# Altium schematic symbol library LATTICEPLDS_Library.SchLib: 291 symbols (part 26 of 32)
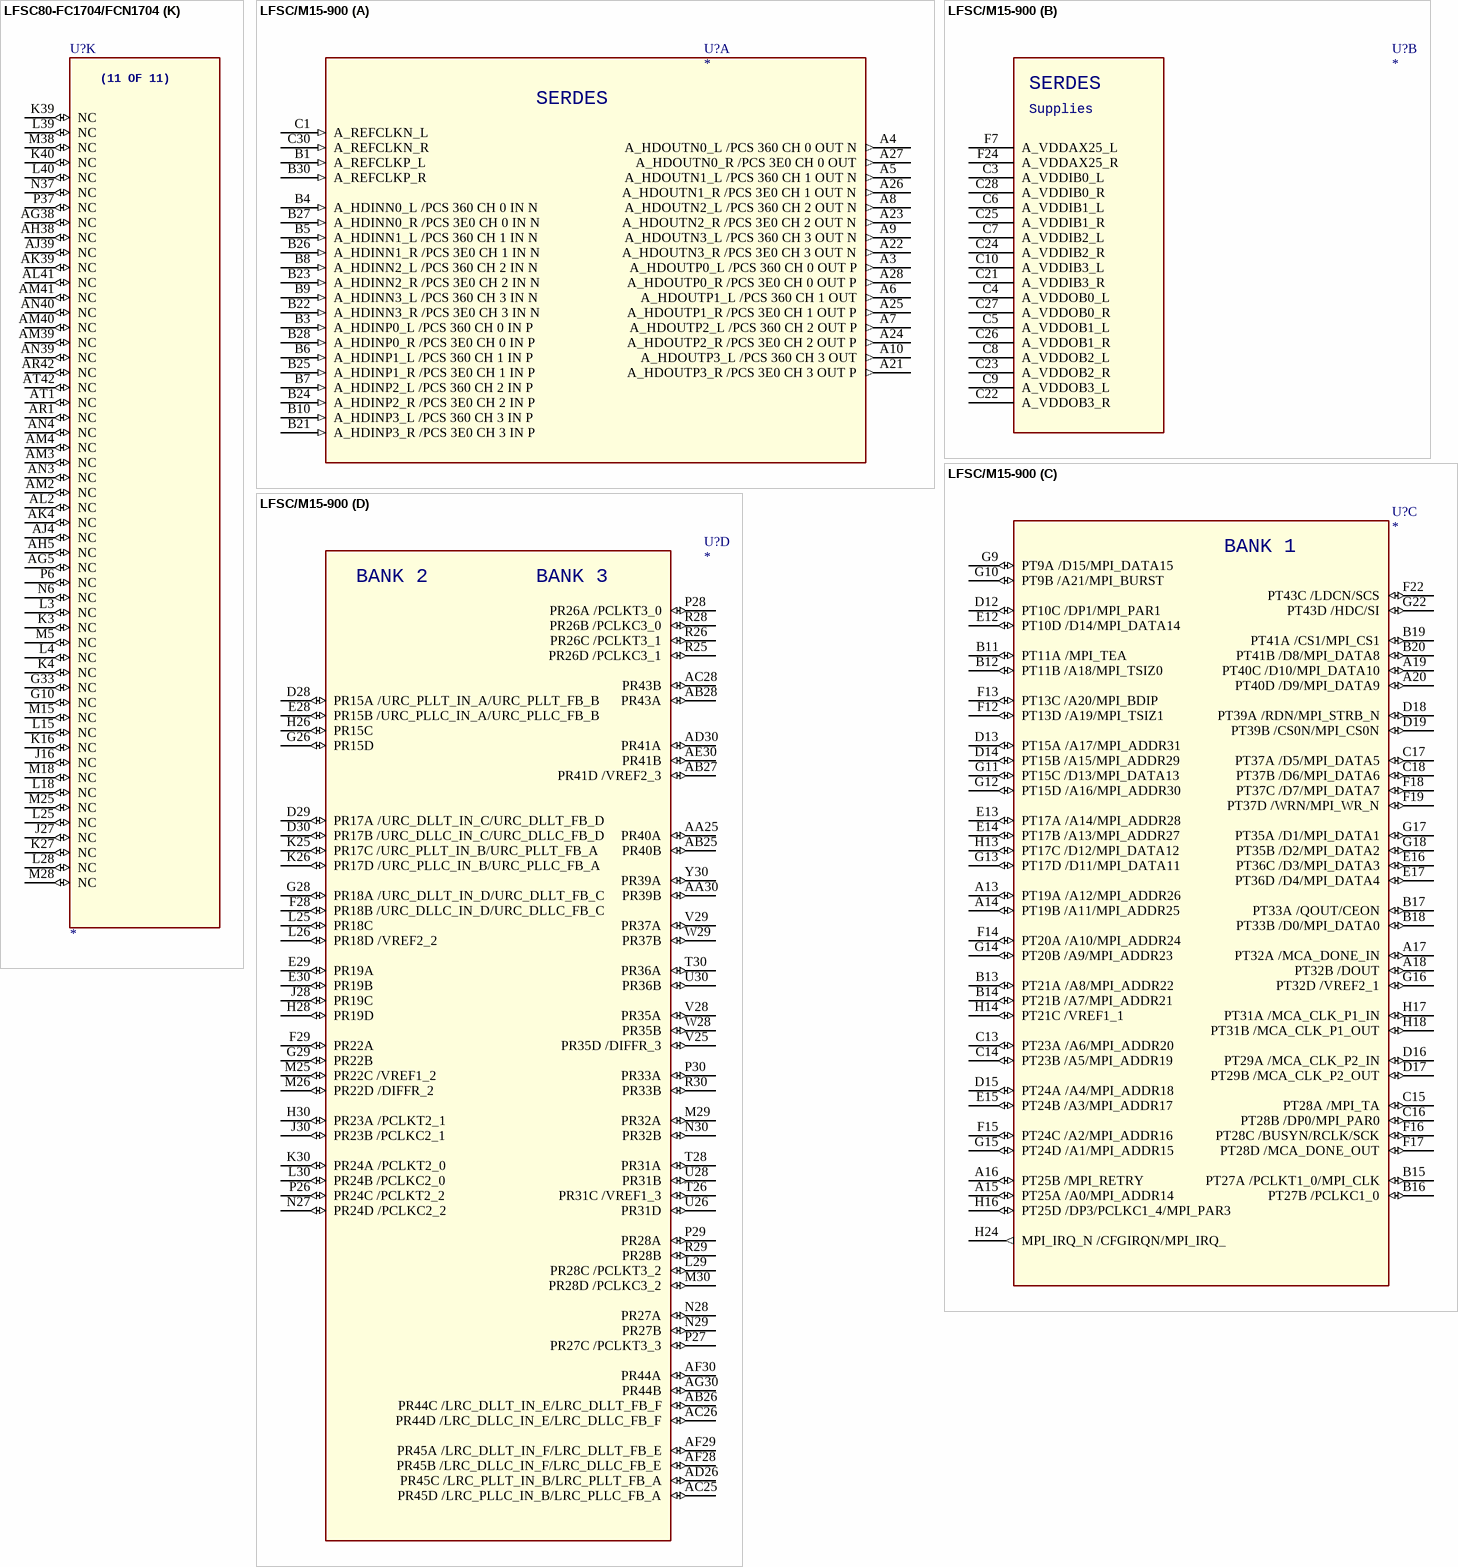
[diagram p328: symbols LFSC80-FC1704/FCN1704 to LFSC/M15-900]

## LFSC80-FC1704/FCN1704
designator U?
SPLIT_INST: TRUE; SWAP_INFO: (S1+S2+S3+S4+S5+S6+S7+S8+S9+S10+S11)
part A pins: AA28 VTT_7 (io), AA29 VTT_7 (io), AA31 PL38D (io), AA32 PL43D (io), AA33 PL47C / PCLKT7_3 (io), AA34 PL48C / PCLKT7_2 (io), AA40 VCCIO7 (io), AB33 PL47D / PCLKC7_3 (io), AB34 PL48D / PCLKC7_2 (io), G40 PL17A / ULC_DLLT_IN_C/ULC_DLLT_FB_D (io), G41 PL18A / ULC_DLLT_IN_D/ULC_DLLT_FB_C (io), G42 PL20A (io), H36 VCCIO7 (io), H40 PL17B / ULC_DLLC_IN_C/ULC_DLLC_FB_D (io), H41 PL18B / ULC_DLLC_IN_D/ULC_DLLC_FB_C (io), H42 PL20B (io), J36 PL25C (io), J37 PL16A / ULC_PLLT_IN_A/ULC_PLLT_FB_B (io), J38 PL16B / ULC_PLLC_IN_A/ULC_PLLC_FB_B (io), J40 VCCIO7 (io), J41 PL24A (io), J42 PL25B (io), K36 PL25D (io), K37 PL21A (io), K38 PL22A (io), K41 PL24B (io), K42 PL25A (io), L35 VCCIO7 (io), L37 PL21B (io), L38 PL22B (io), L41 PL30A (io), L42 PL31A (io), M34 PL20C (io), M35 PL20D (io), M36 PL33C (io), M37 PL33D (io), M39 VCCIO7 (io), M41 PL30B (io), M42 PL31B (io), N33 PL17C / ULC_PLLT_IN_B/ULC_PLLT_FB_A (io), N34 PL21C (io), N35 PL26C (io), N36 PL26D (io), N38 PL26A (io), N39 PL29A (io), N40 PL34B (io), N41 PL35A (io), N42 PL38A (io), P32 PL16C (io), P33 PL17D / ULC_PLLC_IN_B/ULC_PLLC_FB_A (io), P34 PL21D (io), P36 VCCIO7 (io), P38 PL26B (io), P39 PL29B (io), P40 PL34A (io), P41 PL35B (io), P42 PL38B (io), R31 VTT_7 (io), R32 PL16D (io), R33 PL22D (io), R34 PL29C / VREF1_7 (io), R35 PL34C (io), R36 PL37C (io), R37 PL33A (io), R38 PL37A (io), R40 VCCIO7 (io), R41 PL42A (io), R42 PL48A / PCLKT7_0 (io), T29 PL18C (io), T31 VCCIO7 (io), T33 PL22C (io), T34 PL29D / DIFFR_7 (io), T35 PL34D (io), T36 PL37D (io), T37 PL33B (io), T38 PL37B (io), T39 PL41B (io), T40 PL47A / PCLKT7_1 (io), T41 PL42B (io), T42 PL48B / PCLKC7_0 (io), U29 PL18D / VREF2_7 (io), U31 PL24C (io), U32 PL31C (io), U33 PL35D (io), U34 PL39C (io), U35 VCCIO7 (io), U37 PL39A (io), U38 PL46A (io), U39 PL41A (io), U40 PL47B / PCLKC7_1 (io), V29 VTT_7 (io), V31 PL24D (io), V32 PL31D (io), V33 PL35C (io), V34 PL39D (io), V35 PL41C (io), V37 PL39B (io), V38 PL46B (io), V39 VCCIO7 (io), W29 PL30C (io), W32 VCCIO7 (io), W33 PL42C (io), W34 PL46C (io), W35 PL41D (io), W37 PL43A (io), Y29 PL30D (io), Y31 PL38C (io), Y32 PL43C (io), Y33 PL42D (io), Y34 PL46D (io), Y36 VCCIO7 (io), Y37 PL43B (io)
part B pins: AA35 PCLKT6_2 / PL52C (io), AA36 PL56C (io), AA37 PL57C (io), AA38 PL60A (io), AA41 PL61A (io), AA42 PL63A (io), AB28 VTT_6 (io), AB29 VTT_6 (io), AB31 PCLKT6_3 / PL51C (io), AB32 VREF1_6 / PL55C (io), AB35 PCLKC6_2 / PL52D (io), AB36 PL56D (io), AB37 PL57D (io), AB38 PL60B (io), AB39 VCCIO6 (io), AB41 PL61B (io), AB42 PL63B (io), AC29 PL60C (io), AC31 PCLKC6_3 / PL51D (io), AC32 PL55D (io), AC33 PL59C (io), AC34 PL61C (io), AC36 VCCIO6 (io), AC37 PL63C (io), AC38 PL64A (io), AC39 PL65A (io), AC40 PL67A (io), AC41 PL68A (io), AC42 PL69A (io), AD29 PL60D (io), AD32 VCCIO6 (io), AD33 PL59D (io), AD34 PL61D (io), AD35 PL65C (io), AD36 PL64C (io), AD37 PL63D (io), AD38 PL64B (io), AD39 PL65B (io), AD40 PL67B (io), AD41 PL68B (io), AD42 PL69B (io), AE29 VTT_6 (io), AE31 PL73C (io), AE32 PL72C (io), AE33 PL69C (io), AE34 PL68C (io), AE35 PL65D (io), AE36 PL64D (io), AE37 PL67C (io), AE38 PL72A (io), AE40 VCCIO6 (io), AE41 PL73A (io), AE42 PL74A (io), AF29 PL77C (io), AF31 PL73D (io), AF32 PL72D (io), AF33 PL69D (io), AF34 PL68D (io), AF35 VCCIO6 (io), AF37 PL67D (io), AF38 PL72B (io), AF39 PL77A (io), AF40 PL76A (io), AF41 PL73B (io), AF42 PL74B (io), AG29 PL77D (io), AG31 VCCIO6 (io), AG33 PL81C (io), AG34 PL80C (io), AG35 PL78C (io), AG36 PL76C (io), AG37 PL74C (io), AG39 PL77B (io), AG40 PL76B (io), AG41 PL80A (io), AG42 PL78B (io), AH31 PL90C (io), AH32 PL85C (io), AH33 PL81D (io), AH34 PL80D (io), AH35 PL78D (io), AH36 DIFFR_6 / PL76D (io), AH37 PL74D (io), AH39 VCCIO6 (io), AH41 PL80B (io), AH42 PL78A (io), AJ30 VTT_6 (io), AJ31 PL90D (io), AJ32 PL85D (io), AJ33 PL89C (io), AJ34 PL84C (io), AJ36 VCCIO6 (io), AJ37 PL82C (io), AJ38 PL85A (io), AJ40 PL84A (io), AJ41 PL82A (io), AJ42 PL81A (io), AK32 VCCIO6 (io), AK33 VREF2_6 / PL89D (io), AK34 PL84D (io), AK35 PL91C (io), AK36 PL86C (io), AK37 PL82D (io), AK38 PL85B (io), AK40 PL84B (io), AK41 PL82B (io), AK42 PL81B (io), AL35 PL91D (io), AL36 PL86D (io), AL37 LLC_DLLT_IN_E/LLC_DLLT_FB_F / PL93C (io), AL38 PL89A (io), AL40 VCCIO6 (io), AL42 PL86A (io), AM35 VCCIO6 (io), AM37 LLC_DLLC_IN_E/LLC_DLLC_FB_F / PL93D (io), AM38 PL89B (io), AM42 PL86B (io), AN36 LLC_PLLT_IN_B/LLC_PLLT_FB_A / PL95C (io), AN37 PL94C (io), AN38 PL93A (io), AN41 PL91A (io), AN42 PL90A (io), AP36 LLC_PLLC_IN_B/LLC_PLLC_FB_A / PL95D (io), AP37 PL94D (io), AP38 PL93B (io), AP39 VCCIO6 (io), AP41 PL91B (io), AP42 PL90B (io), AR36 VCCIO6 (io), AR39 LLC_DLLT_IN_F/LLC_DLLT_FB_E / PL95A (io), AR40 LLC_DLLC_IN_F/LLC_DLLC_FB_E / PL95B (io), AR41 PL94A (io), AT41 PL94B (io), AU40 VCCIO6 (io), AU41 TEMP (io), U41 PCLKT6_0 / PL50A (io), U42 PL51A (io), V36 PCLKT6_1 / PL50C (io), V41 PCLKC6_0 / PL50B (io), V42 PL51B (io), W36 PCLKC6_1 / PL50D (io), W38 PL52A (io), W39 PL55A (io), W40 PL56A (io), W41 PL57A (io), W42 PL59A (io), Y38 PL52B (io), Y39 PL55B (io), Y40 PL56B (io), Y41 PL57B (io), Y42 PL59B (io)
part C pins: AH22 VTT_5 (io), AJ22 VTT_5 (io), AJ23 VTT_5 (io), AJ24 VTT_5 (io), AJ25 VTT_5 (io), AJ26 PB28C (io), AJ27 PB28D (io), AK29 PB5D / VREF1_5 (io), AK30 PB5C (io), AL22 PB60D (io), AL23 PB56D (io), AL25 PB45C (io), AL26 PB36D (io), AL27 VCCIO5 (io), AL28 PB19D (io), AL29 PB15D (io), AL31 PB11D (io), AL32 PB11C (io), AL33 PB3C / LLC_DLLT_IN_C/LLC_DLLT_FB_D (io), AL34 PB3D / LLC_DLLC_IN_C/LLC_DLLC_FB_D (io), AM22 PB60C (io), AM23 PB56C (io), AM24 VCCIO5 (io), AM25 PB45D (io), AM26 PB36C (io), AM28 PB19C (io), AM29 PB15C (io), AM30 VCCIO5 (io), AM31 PB13C (io), AM32 PB13D (io), AM33 PB4D (io), AM34 PB4C (io), AN22 PB61C (io), AN23 PB57C (io), AN24 PB52D / PCLKC5_6 (io), AN25 PB47C (io), AN26 PB41D (io), AN27 PB37D (io), AN28 PB33C (io), AN29 PB31C (io), AN30 PB24D (io), AN31 PB24C (io), AN32 PB16D (io), AN33 PB16C (io), AN34 PB8D (io), AN35 PB8C (io), AP22 PB61D (io), AP23 PB57D (io), AP24 PB52C / PCLKT5_6 (io), AP25 PB47D (io), AP26 PB41C (io), AP27 PB37C (io), AP28 PB33D (io), AP29 PB31D (io), AP30 PB25D (io), AP31 PB25C (io), AP32 PB23D (io), AP33 PB23C (io), AP34 PB9C (io), AP35 PB9D (io), AR22 PB63D (io), AR24 PB51D / VREF2_5 (io), AR25 PB51C (io), AR26 VCCIO5 (io), AR27 PB40D (io), AR28 PB40C (io), AR30 PB32D (io), AR31 PB32C (io), AR32 VCCIO5 (io), AR33 PB20D (io), AR34 PB20C (io), AR37 PB7C (io), AR38 PB7D (io), AT22 PB63C (io), AT23 VCCIO5 (io), AT24 PB48D / PCLKC5_4 (io), AT25 PB48C / PCLKT5_4 (io), AT27 PB44D (io), AT28 PB44C (io), AT29 VCCIO5 (io), AT30 PB35C (io), AT31 PB35D (io), AT33 PB21C (io), AT34 PB21D (io), AT35 VCCIO5 (io), AT36 PB17D (io), AT37 PB17C (io), AT38 PB12D (io), AT39 PB12C (io), AU22 PB59D (io), AU23 PB59C (io), AU24 PB55C (io), AU25 PB55D (io), AU26 PB53D / PCLKC5_7 (io), AU27 PB53C / PCLKT5_7 (io), AU28 PB49D (io), AU29 PB49C (io), AU30 PB43C (io), AU31 PB43D (io), AU32 PB39C (io), AU33 PB39D (io), AU34 PB29D (io), AU35 PB29C (io), AU36 PB27C (io), AU37 PB27D (io), AU38 PB4A / LLC_DLLT_IN_D/LLC_DLLT_FB_C (io), AU42 PB3A / LLC_PLLT_IN_A/LLC_PLLT_FB_B (io), AV22 PB60B (io), AV23 PB60A (io), AV24 PB53B / PCLKC5_2 (io), AV25 PB53A / PCLKT5_2 (io), AV26 PB44B (io), AV27 PB44A (io), AV28 PB41B (io), AV29 PB41A (io), AV30 PB33B (io), AV31 PB33A (io), AV32 PB27B (io), AV33 PB27A (io), AV34 PB21B (io), AV35 PB21A (io), AV36 PB13B (io), AV37 PB13A (io), AV38 PB4B / LLC_DLLC_IN_D/LLC_DLLC_FB_C (io), AV39 PB8B (io), AV40 PB8A (io), AV41 PB5A (io), AV42 PB3B / LLC_PLLC_IN_A/LLC_PLLC_FB_B (io), AW23 PB57B (io), AW24 PB57A (io), AW25 VCCIO5 (io), AW26 PB49B / PCLKC5_5 (io), AW27 PB49A / PCLKT5_5 (io), AW29 PB37B (io), AW30 PB37A (io), AW31 VCCIO5 (io), AW32 PB29B (io), AW33 PB29A (io), AW35 PB19B (io), AW36 PB19A (io), AW37 VCCIO5 (io), AW38 PB11B (io), AW39 PB11A (io), AW40 PB9A (io), AW41 PB5B (io), AW42 PB7A (io), AY22 VCCIO5 (io), AY23 PB59A (io), AY24 PB59B (io), AY26 PB48B / PCLKC5_3 (io), AY27 PB48A / PCLKT5_3 (io), AY28 VCCIO5 (io), AY29 PB43B (io), AY30 PB43A (io), AY32 PB32B (io), AY33 PB32A (io), AY34 VCCIO5 (io), AY35 PB24B (io), AY36 PB24A (io), AY38 PB16B (io), AY39 PB16A (io), AY40 PB9B (io), AY41 PB12A (io), AY42 PB7B (io), BA22 PB61B (io), BA23 PB61A (io), BA24 PB55B (io), BA25 PB55A (io), BA26 PB52B / PCLKC5_1 (io), BA27 PB52A / PCLKT5_1 (io), BA28 PB45B (io), BA29 PB45A (io), BA30 PB39B (io), BA31 PB39A (io), BA32 PB35B (io), BA33 PB35A (io), BA34 PB28B (io), BA35 PB28A (io), BA36 PB23B (io), BA37 PB23A (io), BA38 PB17B (io), BA39 PB17A (io), BA40 PB15A (io), BA41 PB12B (io), BB22 PB63B (io), BB23 PB63A (io), BB24 PB56A (io), BB25 PB56B (io), BB26 PB51B / PCLKC5_0 (io), BB27 PB51A / PCLKT5_0 (io), BB28 PB47B (io), BB29 PB47A (io), BB30 PB40B (io), BB31 PB40A (io), BB32 PB36B (io), BB33 PB36A (io), BB34 PB31B (io), BB35 PB31A (io), BB36 PB25B (io), BB37 PB25A (io), BB38 PB20A (io), BB39 PB20B (io), BB40 PB15B (io)
part D pins: AH21 VTT_4 (io), AJ16 PB99C (io), AJ17 PB99D (io), AJ18 VTT_4 (io), AJ19 VTT_4 (io), AJ20 VTT_4 (io), AJ21 VTT_4 (io), AK13 PB123D (io), AK14 VREF1_4 / PB123C (io), AL9 LRC_DLLC_IN_D/LRC_DLLC_FB_C / PB125D (io), AL10 LRC_DLLT_IN_D/LRC_DLLT_FB_C / PB125C (io), AL11 PB120D (io), AL12 PB120C (io), AL14 PB112D (io), AL15 PB100D (io), AL16 VCCIO4 (io), AL17 PB88D (io), AL18 PB81C (io), AL20 PB71D (io), AL21 PB67D (io), AM9 PB124D (io), AM10 PB124C (io), AM11 PB115D (io), AM12 PB115C (io), AM13 VCCIO4 (io), AM14 PB112C (io), AM15 PB100C (io), AM17 PB88C (io), AM18 PB81D (io), AM19 VCCIO4 (io), AM20 PB71C (io), AM21 PB67C (io), AN8 PB121D (io), AN9 PB121C (io), AN10 PB113D (io), AN11 PB113C (io), AN12 PB105D (io), AN13 PB105C (io), AN14 PB96D (io), AN15 PB92D (io), AN16 PB89D (io), AN17 PB83D (io), AN18 PB79C (io), AN19 PCLKT4_7 / PB74C (io), AN20 PB70D (io), AN21 PB66D (io), AP8 PB117D (io), AP9 PB117C (io), AP10 PB108D (io), AP11 PB108C (io), AP12 PB101D (io), AP13 PB101C (io), AP14 PB96C (io), AP15 PB92C (io), AP16 PB89C (io), AP17 PB83C (io), AP18 PB79D (io), AP19 PCLKC4_7 / PB74D (io), AP20 PB70C (io), AP21 PB66C (io), AR5 PB119D (io), AR6 PB119C (io), AR9 PB109D (io), AR10 PB109C (io), AR11 VCCIO4 (io), AR12 PB95D (io), AR13 PB95C (io), AR15 PB85D (io), AR16 PB85C (io), AR17 VCCIO4 (io), AR18 PB77D (io), AR19 VREF2_4 / PB77C (io), AR21 PB65C (io), AT4 PB116D (io), AT5 PB116C (io), AT6 PB111D (io), AT7 PB111C (io), AT8 VCCIO4 (io), AT9 PB107D (io), AT10 PB107C (io), AT12 PB93D (io), AT13 PB93C (io), AT14 VCCIO4 (io), AT15 PB84D (io), AT16 PB84C (io), AT18 PCLKC4_6 / PB75D (io), AT19 PCLKT4_6 / PB75C (io), AT20 VCCIO4 (io), AT21 PB65D (io), AU1 LRC_PLLC_IN_A/LRC_PLLC_FB_B / PB125B (io), AU5 PB120A (io), AU6 PB104D (io), AU7 PB104C (io), AU8 PB103D (io), AU9 PB103C (io), AU10 PB97D (io), AU11 PB97C (io), AU12 PB91D (io), AU13 PB91C (io), AU14 PB87D (io), AU15 PB87C (io), AU16 PCLKC4_4 / PB80D (io), AU17 PCLKT4_4 / PB80C (io), AU18 PB73D (io), AU19 PB73C (io), AU20 PB69D (io), AU21 PB69C (io), AV1 LRC_PLLT_IN_A/LRC_PLLT_FB_B / PB125A (io), AV2 LRC_DLLT_IN_C/LRC_DLLT_FB_D / PB124A (io), AV3 PB121A (io), AV4 PB121B (io), AV5 PB120B (io), AV6 PB115B (io), AV7 PB115A (io), AV8 PB107B (io), AV9 PB107A (io), AV10 PB101B (io), AV11 PB101A (io), AV12 PB93B (io), AV13 PB93A (io), AV14 PB85B (io), AV15 PB85A (io), AV16 PB81B (io), AV17 PB81A (io), AV18 PCLKC4_2 / PB74B (io), AV19 PCLKT4_2 / PB74A (io), AV20 PB67B (io), AV21 PB67A (io), AW1 PB123A (io), AW2 LRC_DLLC_IN_C/LRC_DLLC_FB_D / PB124B (io), AW3 PB119B (io), AW4 PB116B (io), AW5 PB116A (io), AW7 PB108B (io), AW8 PB108A (io), AW9 VCCIO4 (io), AW10 PB99B (io), AW11 PB99A (io), AW13 PB89B (io), AW14 PB89A (io), AW15 VCCIO4 (io), AW16 PCLKC4_3 / PB80B (io), AW17 PCLKT4_3 / PB80A (io), AW19 PB70B (io), AW20 PB70A (io), AW21 VCCIO4 (io), AY1 PB123B (io), AY2 PB117A (io), AY3 PB119A (io), AY4 PB113B (io), AY5 PB113A (io), AY6 VCCIO4 (io), AY7 PB104B (io), AY8 PB104A (io), AY10 PB96B (io), AY11 PB96A (io), AY12 VCCIO4 (io), AY13 PB87B (io), AY14 PB87A (io), AY16 PCLKC4_5 / PB79B (io), AY17 PCLKT4_5 / PB79A (io), AY18 VCCIO4 (io), AY19 PB69B (io), AY20 PB69A (io), BA2 PB117B (io), BA3 PB112B (io), BA4 PB111B (io), BA5 PB111A (io), BA6 PB105B (io), BA7 PB105A (io), BA8 PB100B (io), BA9 PB100A (io), BA10 PB95B (io), BA11 PB95A (io), BA12 PB91B (io), BA13 PB91A (io), BA14 PB84B (io), BA15 PB84A (io), BA16 PCLKC4_0 / PB77B (io), BA17 PCLKT4_0 / PB77A (io), BA18 PB73B (io), BA19 PB73A (io), BA20 PB66B (io), BA21 PB66A (io), BB3 PB112A (io), BB4 PB109B (io), BB5 PB109A (io), BB6 PB103B (io), BB7 PB103A (io), BB8 PB97B (io), BB9 PB97A (io), BB10 PB92B (io), BB11 PB92A (io), BB12 PB88B (io), BB13 PB88A (io), BB14 PB83B (io), BB15 PB83A (io), BB16 PCLKC4_1 / PB75B (io), BB17 PCLKT4_1 / PB75A (io), BB18 PB71B (io), BB19 PB71A (io), BB20 PB65B (io), BB21 PB65A (io)
part E pins: AA1 PR63A (io), AA2 PR61A (io), AA5 PR60A (io), AA6 PR57C (io), AA7 PR56C (io), AA8 PR52C / PCLKT3_2 (io), AB1 PR63B (io), AB2 PR61B (io), AB3 VCCIO3 (io), AB5 PR60B (io), AB6 PR57D (io), AB7 PR56D (io), AB8 PR52D / PCLKC3_2 (io), AB11 PR55C / VREF1_3 (io), AB12 PR51C / PCLKT3_3 (io), AB14 VTT_3 (io), AB15 VTT_3 (io), AC1 PR69A (io), AC2 PR68A (io), AC3 PR67A (io), AC4 PR65A (io), AC5 PR64A (io), AC6 PR63C (io), AC7 VCCIO3 (io), AC9 PR61C (io), AC10 PR59C (io), AC11 PR55D (io), AC12 PR51D / PCLKC3_3 (io), AC14 PR60C (io), AD1 PR69B (io), AD2 PR68B (io), AD3 PR67B (io), AD4 PR65B (io), AD5 PR64B (io), AD6 PR63D (io), AD7 PR64C (io), AD8 PR65C (io), AD9 PR61D (io), AD10 PR59D (io), AD11 VCCIO3 (io), AD14 PR60D (io), AE1 PR74A (io), AE2 PR73A (io), AE4 VCCIO3 (io), AE5 PR72A (io), AE6 PR67C (io), AE7 PR64D (io), AE8 PR65D (io), AE9 PR68C (io), AE10 PR69C (io), AE11 PR72C (io), AE12 PR73C (io), AE14 VTT_3 (io), AF1 PR74B (io), AF2 PR73B (io), AF3 PR76A (io), AF4 PR77A (io), AF5 PR72B (io), AF6 PR67D (io), AF8 VCCIO3 (io), AF9 PR68D (io), AF10 PR69D (io), AF11 PR72D (io), AF12 PR73D (io), AF14 PR77C (io), AG1 PR78B (io), AG2 PR80A (io), AG3 PR76B (io), AG4 PR77B (io), AG6 PR74C (io), AG7 PR76C (io), AG8 PR78C (io), AG9 PR80C (io), AG10 PR81C (io), AG12 VCCIO3 (io), AG14 PR77D (io), AH1 PR78A (io), AH2 PR80B (io), AH3 VCCIO3 (io), AH6 PR74D (io), AH7 PR76D / DIFFR_3 (io), AH8 PR78D (io), AH9 PR80D (io), AH10 PR81D (io), AH11 PR85C (io), AH12 PR90C (io), AJ1 PR81A (io), AJ2 PR82A (io), AJ3 PR84A (io), AJ5 PR85A (io), AJ6 PR82C (io), AJ7 VCCIO3 (io), AJ9 PR84C (io), AJ10 PR89C (io), AJ11 PR85D (io), AJ12 PR90D (io), AJ13 VTT_3 (io), AK1 PR81B (io), AK2 PR82B (io), AK3 PR84B (io), AK5 PR85B (io), AK6 PR82D (io), AK7 PR86C (io), AK8 PR91C (io), AK9 PR84D (io), AK10 PR89D / VREF2_3 (io), AK11 VCCIO3 (io), AL1 PR86A (io), AL4 VCCIO3 (io), AL5 PR89A (io), AL6 PR93C / LRC_DLLT_IN_E/LRC_DLLT_FB_F (io), AL7 PR86D (io), AL8 PR91D (io), AM1 PR86B (io), AM5 PR89B (io), AM6 PR93D / LRC_DLLC_IN_E/LRC_DLLC_FB_F (io), AM8 VCCIO3 (io), AN1 PR90A (io), AN2 PR91A (io), AN5 PR93A (io), AN6 PR94C (io), AN7 PR95C / LRC_PLLT_IN_B/LRC_PLLT_FB_A (io), AP1 PR90B (io), AP2 PR91B (io), AP3 VCCIO3 (io), AP5 PR93B (io), AP6 PR94D (io), AP7 PR95D / LRC_PLLC_IN_B/LRC_PLLC_FB_A (io), AR2 PR94A (io), AR3 PR95B / LRC_DLLC_IN_F/LRC_DLLC_FB_E (io), AR4 PR95A / LRC_DLLT_IN_F/LRC_DLLT_FB_E (io), AR7 VCCIO3 (io), AT2 PR94B (io), AU4 VCCIO3 (io), U1 PR51A (io), U2 PR50A / PCLKT3_0 (io), V1 PR51B (io), V2 PR50B / PCLKC3_0 (io), V7 PR50C / PCLKT3_1 (io), W1 PR59A (io), W2 PR57A (io), W3 PR56A (io), W4 PR55A (io), W5 PR52A (io), W7 PR50D / PCLKC3_1 (io), Y1 PR59B (io), Y2 PR57B (io), Y3 PR56B (io), Y4 PR55B (io), Y5 PR52B (io)
part F pins: AA4 VCCIO2 (io), AA9 PCLKT2_2 / PR48C (io), AA10 PCLKT2_3 / PR47C (io), AA11 PR43D (io), AA12 PR38D (io), AA14 VTT_2 (io), AA15 VTT_2 (io), AB9 PCLKC2_2 / PR48D (io), AB10 PCLKC2_3 / PR47D (io), G1 PR20A (io), G2 URC_DLLT_IN_D/URC_DLLT_FB_C / PR18A (io), G3 URC_DLLT_IN_C/URC_DLLT_FB_D / PR17A (io), H1 PR20B (io), H2 URC_DLLC_IN_D/URC_DLLC_FB_C / PR18B (io), H3 URC_DLLC_IN_C/URC_DLLC_FB_D / PR17B (io), H7 VCCIO2 (io), J1 PR25B (io), J2 PR24A (io), J4 VCCIO2 (io), J5 URC_PLLC_IN_A/URC_PLLC_FB_B / PR16B (io), J6 URC_PLLT_IN_A/URC_PLLT_FB_B / PR16A (io), J7 PR25C (io), K1 PR25A (io), K2 PR24B (io), K5 PR22A (io), K6 PR21A (io), K7 PR25D (io), L1 PR31A (io), L2 PR30A (io), L5 PR22B (io), L6 PR21B (io), L8 VCCIO2 (io), M1 PR31B (io), M2 PR30B (io), M3 VCCIO2 (io), M6 PR33D (io), M7 PR33C (io), M8 PR20D (io), M9 PR20C (io), N1 PR38A (io), N2 PR35A (io), N3 PR34B (io), N4 PR29A (io), N5 PR26A (io), N7 PR26D (io), N8 PR26C (io), N9 PR21C (io), N10 URC_PLLT_IN_B/URC_PLLT_FB_A / PR17C (io), P1 PR38B (io), P2 PR35B (io), P3 PR34A (io), P4 PR29B (io), P5 PR26B (io), P7 VCCIO2 (io), P9 PR21D (io), P10 URC_PLLC_IN_B/URC_PLLC_FB_A / PR17D (io), P11 PR16C (io), R1 PCLKT2_0 / PR48A (io), R2 PR42A (io), R4 VCCIO2 (io), R5 PR37A (io), R6 PR33A (io), R7 PR37C (io), R8 PR34C (io), R9 VREF1_2 / PR29C (io), R10 PR22D (io), R11 PR16D (io), R12 VTT_2 (io), T1 PCLKC2_0 / PR48B (io), T2 PR42B (io), T3 PCLKT2_1 / PR47A (io), T4 PR41B (io), T5 PR37B (io), T6 PR33B (io), T7 PR37D (io), T8 PR34D (io), T9 PR29D (io), T10 PR22C (io), T12 VCCIO2 (io), T14 PR18C (io), U3 PCLKC2_1 / PR47B (io), U4 PR41A (io), U5 PR46A (io), U6 PR39A (io), U8 VCCIO2 (io), U9 PR39C (io), U10 PR35D (io), U11 PR31C (io), U12 PR24C (io), U14 VREF2_2 / PR18D (io), V3 VCCIO2 (io), V5 PR46B (io), V6 PR39B (io), V8 PR41C (io), V9 PR39D (io), V10 PR35C (io), V11 PR31D (io), V12 PR24D (io), V14 VTT_2 (io), W6 PR43A (io), W8 PR41D (io), W9 PR46C (io), W10 PR42C (io), W11 VCCIO2 (io), W14 PR30C (io), Y6 PR43B (io), Y7 VCCIO2 (io), Y9 PR46D (io), Y10 PR42D (io), Y11 PR43C (io), Y12 PR38C (io), Y14 PR30D (io)
part G pins: A19 PT73B / D2/MPI_DATA2 (io), A20 PT66A / MPI_TA (io), A21 PT66B / DP0/MPI_PAR0 (io), A22 PT63A / A0/MPI_ADDR14 (io), A23 PT63B / MPI_RETRY (io), A24 PT57B / A9/MPI_ADDR23 (io), B19 PT73A / D1/MPI_DATA1 (io), B20 PT71B / D0/MPI_DATA0 (io), B21 PT67B / MCA_CLK_P2_OUT (io), B22 PT61B / A3/MPI_ADDR17 (io), B23 PT61A / A4/MPI_ADDR18 (io), B24 PT57A / A10/MPI_ADDR24 (io), C20 PT71A / QOUT/CEON (io), C21 PT67A / MCA_CLK_P1_IN (io), C23 PT59A / A8/MPI_ADDR22 (io), C25 PT52B / A18/MPI_TSIZ0 (io), C26 PT52A / MPI_TEA (io), D18 PT75A / RDN/MPI_STRB_N (io), D19 PT75B / CS0N/MPI_CS0N (io), D20 PT69B / MCA_CLK_P1_OUT (io), D22 PT60B / A5/MPI_ADDR19 (io), D23 PT59B / A7/MPI_ADDR21 (io), E18 PT77A / CS1/MPI_CS1 (io), E19 PT74B / D6/MPI_DATA6 (io), E20 PT69A / MCA_CLK_P1_IN (io), E21 PT65B / PCLKC1_0 (io), E22 PT60A / A6/MPI_ADDR20 (io), E23 PT55B / A13/MPI_ADDR27 (io), E24 PT55A / A14/MPI_ADDR28 (io), F3 VCCIO1 (io), F18 PT77B / D8/MPI_DATA8 (io), F19 PT74A / D5/MPI_DATA5 (io), F20 PT70B / DOUT (io), F21 PT65A / PCLKT1_0/MPI_CLK (io), F22 PT56A / A12/MPI_ADDR26 (io), F23 PT56B / A11/MPI_ADDR25 (io), F24 PT51B / A21/MPI_BURST (io), F25 PT51A / D15/MPI_DATA15 (io), F26 PT53B / A15/MPI_ADDR29 (io), F27 PT53A / A17/MPI_ADDR31 (io), F39 VCCIO1 (io), G8 VCCIO1 (io), G18 PT77D / HDC (io), G19 PT75C / D10/MPI_DATA10 (io), G20 PT70A / MCA_DONE_IN (io), G21 PT67C / D22/PCLKT1_1/MPI_DATA22 (io), G22 PT63D / DP3/PCLKC1_4/MPI_PAR3 (io), G23 PT53D / A16/MPI_ADDR30 (io), G24 PT53C / D13/MPI_DATA13 (io), G35 VCCIO1 (io), H17 PT71D / D16/PCLKC1_3/MPI_DATA16 (io), H18 PT77C / LDCN (io), H19 PT75D / D9/MPI_DATA9 (io), H21 PT67D / D21/PCLKC1_1/MPI_DATA21 (io), H22 PT63C / D24/PCLKT1_4/MPI_DATA24 (io), H24 PT52C / A20/MPI_BDIP (io), H25 PT52D / A19/MPI_TSIZ1 (io), J17 PT71C / D17/PCLKT1_3/MPI_DATA17 (io), J18 PT73C / D3/MPI_DATA3 (io), J19 PT69C / D20/PCLKT1_2/MPI_DATA20 (io), J20 PT74D / WRN/MPI_WR_N (io), J21 PT65D / D23/MPI_DATA23 (io), J22 PT59C / VREF1_1 (io), J23 PT60C / D26/PCLKT1_5/MPI_DATA26 (io), J24 PT51C / DP1/MPI_PAR1 (io), J25 PT56C / D31/PCLKT1_7/MPI_DATA31 (io), J26 PT55D / D11/MPI_DATA11 (io), K18 PT73D / D4/MPI_DATA4 (io), K19 PT69D / D19/PCLKC1_2/MPI_DATA19 (io), K20 PT74C / D7/MPI_DATA7 (io), K21 PT65C / DP2/MPI_PAR2 (io), K22 PT59D / D27/MPI_DATA27 (io), K23 PT60D / D25/PCLKC1_5/MPI_DATA25 (io), K24 PT51D / D14/MPI_DATA14 (io), K25 PT56D / D30/PCLKC1_7/MPI_DATA30 (io), K26 PT55C / D12/MPI_DATA12 (io), L19 VCCIO1 (io), L20 PT70C / D18/MPI_DATA18 (io), L21 PT66C / BUSYN/RCLK (io), L22 PT61D / A1/MPI_ADDR15 (io), L23 PT57D / D28/PCLKC1_6/MPI_DATA28 (io), L24 VCCIO1 (io), M16 VCCIO1 (io), M20 PT70D / VREF2_1 (io), M21 PT66D / MCA_DONE_OUT (io), M22 PT61C / A2/MPI_ADDR16 (io), M23 PT57C / D29/PCLKT1_6/MPI_DATA29 (io), M27 VCCIO1 (io), N11 VCCIO1 (io), N32 VCCIO1 (io), P13 CCLK (io), P17 PROGRAMN (io), P21 MPIIRQN / CFGIRQN/MPI_IRQ_N (io), P22 M1 (io), P23 INITN (io), P24 M2 (io), P25 RESETN (io), P26 RDCFGN (io), P30 M0 (io), P31 DONE (io), R22 M3 (io)